# Altium footprint library SIM_CARD_MINI.PcbLib: 1 footprints
Each footprint in its own frame and in the unit in brackets; x right, y up, seen from the top. Pads: shape width x height; smd on the part's side, far side on the other; paste and mask are expansions set on the pad; w line width, h text height; cw(c..) or ccw(c..) is an arc to the next point about the centre after c.
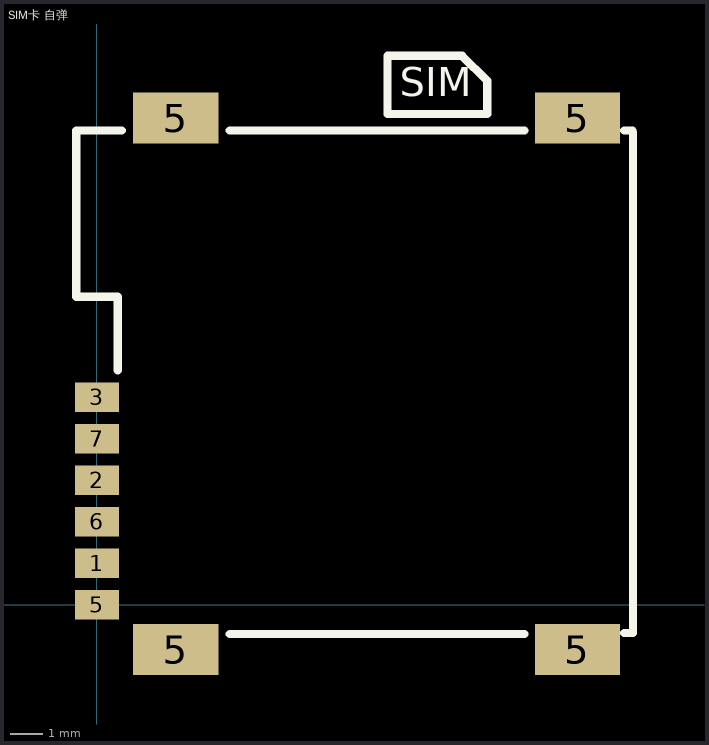
[diagram p0: the footprint, top view; thin cyan lines are the x and y axes]

## SIM卡 自弹 [mm]
pads (10):
  rect 1.34x0.9 smd: 1(0,1.27) 2(0,3.81) 3(0,6.35) 5(0,0) 6(0,2.54) 7(0,5.08)
  rect 2.61x1.56 smd: 5(2.413,-1.372) 5(2.413,14.884) 5(14.7,-1.372) 5(14.7,14.884)
Top Overlay:
  lines w0.254: -0.635,14.452 -0.635,9.423 0.635,9.423 ; -0.635,14.503 0.762,14.503 ; 0.635,7.168 0.635,9.361 ; 4.064,-0.898 13.081,-0.898 ; 4.064,14.503 13.081,14.503 ; 16.129,-0.864 16.383,-0.864 ; 16.129,14.503 16.383,14.503 ; 16.4,-0.864 16.4,14.452 ; 8.89,15.011 11.938,15.011 11.938,16.027 11.176,16.789 8.89,16.789 8.89,15.011
  text "SIM" at 9.271,15.265 h1.52